# Altium schematic symbol library Analog Devices Data Converters Digital-to-Analog Converters.SchLib: 2231 symbols (part 53 of 135)
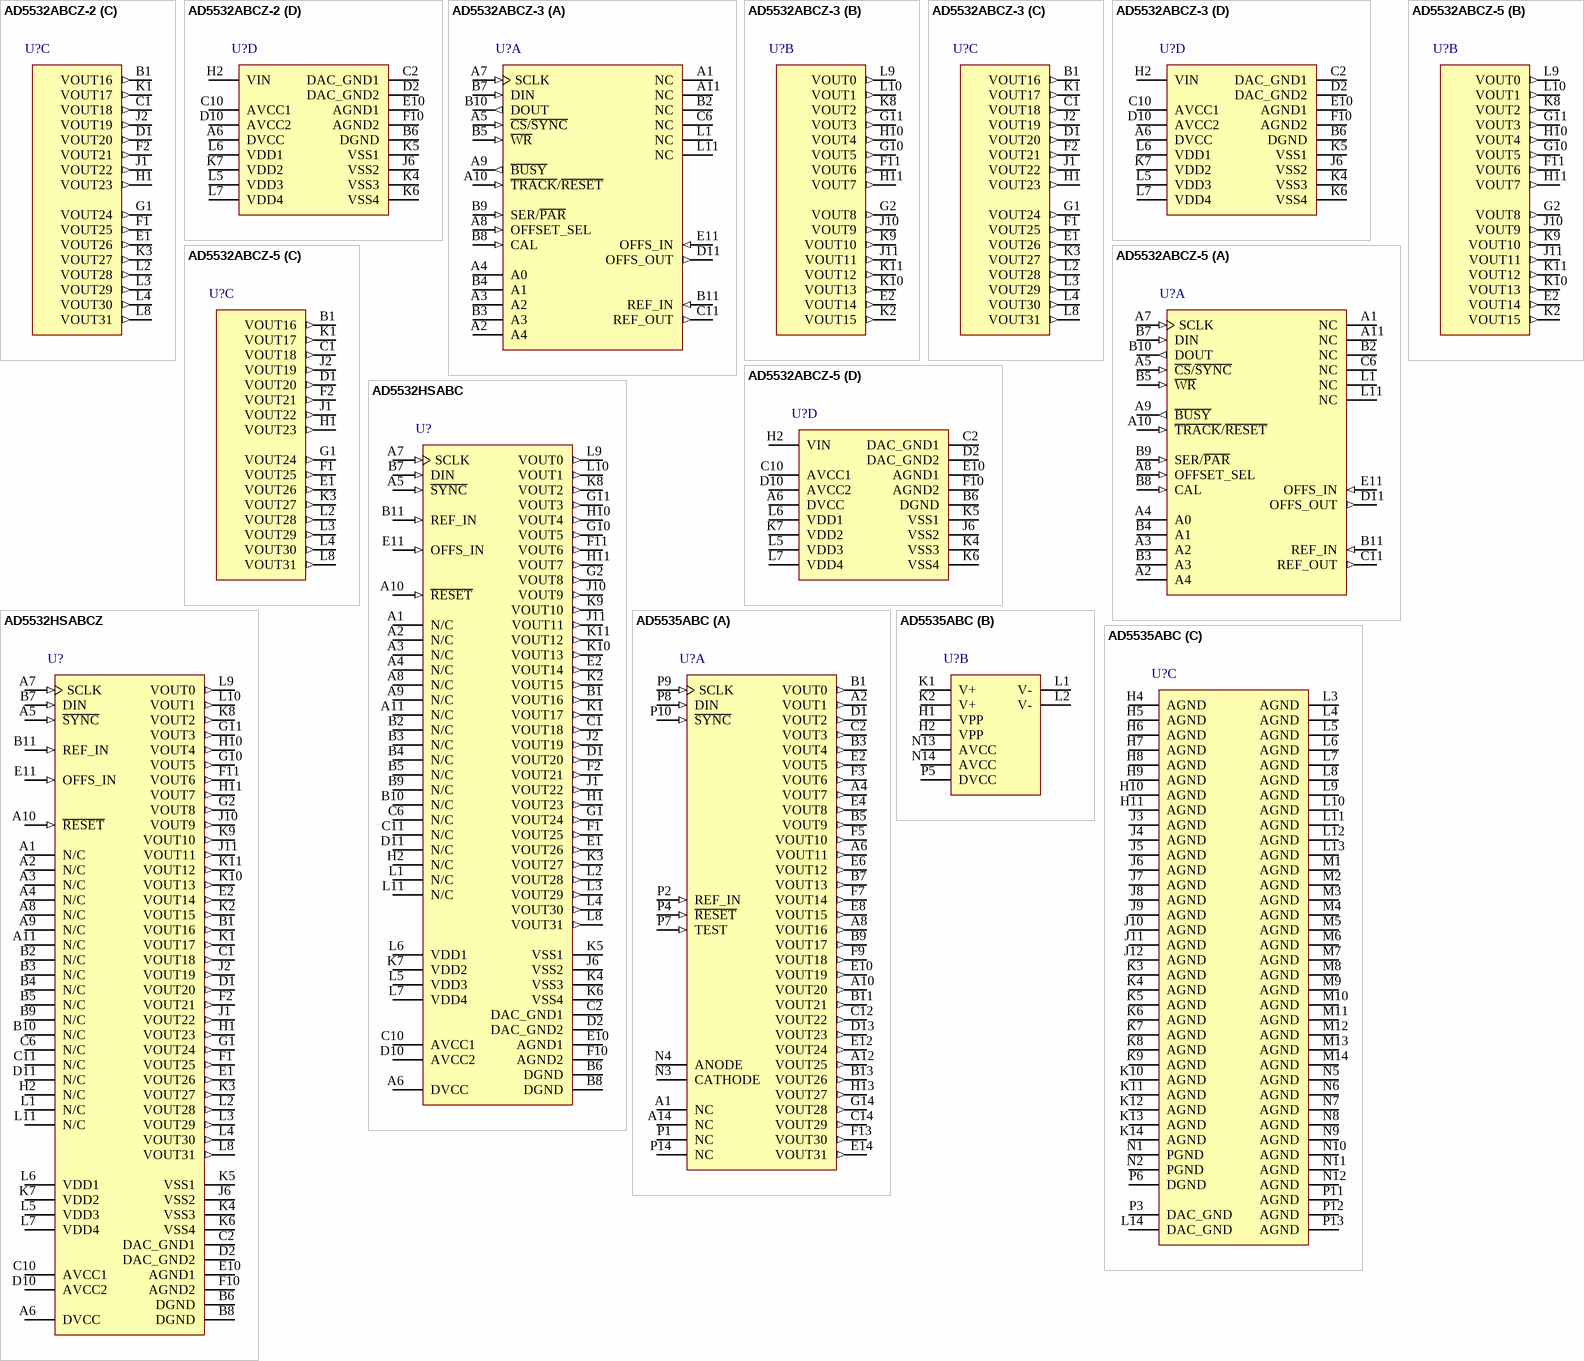
[diagram p165: symbols AD5532ABCZ-2 to AD5535ABC]

## AD5532ABCZ-5
designator U?
32 Channel 14-Bit Digital-to-Analog Converter, -40 to +85 degC, BC-74, Pb-Free, Tray; Generic Part Number: AD5532; Manufacturer: Analog Devices; PartNumber: AD5532ABCZ-5; # DAC Outputs: 32; Max V+: 16.5V; Op Pwr Diss: 623mW; Resolution (Bits): 14; Settling Time: 22µs; Single Supply: No; DatasheetVersion: Rev.D; PackageVersion: 061306-A; PackageReference: BC-74; PackageDescription: 74-Ball Chip Scale Package Ball Grid Array [CSP_BGA]; Supplier 1: Digi-Key; Supplier Part Number 1: AD5532ABCZ-5-ND; Supplier 2: Mouser; Supplier Part Number 2: 584-AD5532ABCZ-5; Packing: Tray; RoHS: Y; Mounting Technology: Surface Mount; Code_JEDEC: MO-192-ABD-1; ComponentLink1Description: Manufacturer URL; ComponentLink1URL: http://www.analog.com/en/index.html; ComponentLink2Description: Datasheet; ComponentLink2URL: http://www.analog.com/static/imported-files/data_sheets/AD5532.pdf; ComponentLink3Description: Package Specification; ComponentLink3URL: http://www.analog.com/static/imported-files/packages/466795438540441203902150BC_74.pdf; ComponentLink4Description: Product URL; ComponentLink4URL: http://www.analog.com/en/digital-to-analog-converters/da-converters/ad5532/products/product.html
footprint BC-74 (BGA, 74-Leads, Body 12x12mm, Pitch 1mm)
part A pins: A1 NC "Not connected", A2 A4 "Parallel Interface: 5 address pins for 32 channels. A4 = MSB of channel address. A0 = LSB. Internal pull-up devices on these logic inputs. Therefore, they can be left floating and default to a logic high condition.", A3 A2 "Parallel Interface: 5 address pins for 32 channels. A4 = MSB of channel address. A0 = LSB. Internal pull-up devices on these logic inputs. Therefore, they can be left floating and default to a logic high condition.", A4 A0 "Parallel Interface: 5 address pins for 32 channels. A4 = MSB of channel address. A0 = LSB. Internal pull-up devices on these logic inputs. Therefore, they can be left floating and default to a logic high condition.", A5 ~{CS}/~{SYNC} (in) "This is the active low Chip Select pin for the parallel interface and the Frame Synchronization pin for the serial interface.", A7 SCLK (in) "Serial Clock Input for Serial Interface. This operates at clock speeds up to 14 MHz (20 MHz in ISHA mode).", A8 OFFSET_SEL (in) "Parallel interface: Offset Select pin; active high. This is used to select the offset channel. Internal pull-down devices on these logic inputs. Therefore, they can be left floating and default to a logic low condition", A9 ~{BUSY} (out) "This output tells the user when the input voltage is being acquired. It goes low during acquisition and returns high when the acquisition operation is complete.", A10 ~{TRACK}/~{RESET} (in) "If this input is held high, VIN is acquired once the channel is addressed. While it is held low, the input to the gain/offset stage is switched directly to VIN. The addressed channel begins to acquire VIN on the rising edge (See Datasheet)", A11 NC "Not connected", B2 NC "Not connected", B3 A3 "Parallel Interface: 5 address pins for 32 channels. A4 = MSB of channel address. A0 = LSB. Internal pull-up devices on these logic inputs. Therefore, they can be left floating and default to a logic high condition.", B4 A1 "Parallel Interface: 5 address pins for 32 channels. A4 = MSB of channel address. A0 = LSB. Internal pull-up devices on these logic inputs. Therefore, they can be left floating and default to a logic high condition.", B5 ~{WR} (in) "Parallel interface: Write pin; active low. This is used in conjunction with the C\S\ pin to address the device using the parallel interface. Internal pull-down devices on these logic inputs. Therefore, they can be left (See Datasheet)", B7 DIN (in) "Data Input for Serial Interface. Data must be valid on the falling edge of SCLK. Internal pull-up devices on these logic inputs. Therefore, they can be left floating and default to a logic high condition.", B8 CAL (in) "Parallel Interface: Control input that allows all 32 channels to acquire VIN simultaneously. Internal pull-down devices on these logic inputs. Therefore, they can be left floating and default to a logic low condition", B9 SER/~{PAR} (in) "This pin allows the user to select whether the serial or parallel interface is used. If the pin is tied low, the parallel interface is used. If it is tied high, the serial interface is used. Internal pull-down devices on (See Datasheet)", B10 DOUT (out) "Output from the DAC registers for read back. Data is clocked out on the rising edge of SCLK and is valid on the falling edge of SCLK.", B11 REF_IN (in) "Reference voltage for Channels 0-31.", C6 NC "Not connected", C11 REF_OUT (out) "Reference Output Voltage.", D11 OFFS_OUT (out) "Offset Output. This is the acquired/programmed offset voltage which can be tied to OFFS_IN to offset the span.", E11 OFFS_IN (in) "Offset Input. The user can supply a voltage here to offset the output span. OFFS_OUT can also be tied to this pin if the user wants to drive this pin with the offset channel.", L1 NC "Not connected", L11 NC "Not connected"
part B pins: E2 VOUT14 (out) "Analog Output Voltages from the 32 channels.", F11 VOUT6 (out) "Analog Output Voltages from the 32 channels.", G2 VOUT8 (out) "Analog Output Voltages from the 32 channels.", G10 VOUT5 (out) "Analog Output Voltages from the 32 channels.", G11 VOUT3 (out) "Analog Output Voltages from the 32 channels.", H10 VOUT4 (out) "Analog Output Voltages from the 32 channels.", H11 VOUT7 (out) "Analog Output Voltages from the 32 channels.", J10 VOUT9 (out) "Analog Output Voltages from the 32 channels.", J11 VOUT11 (out) "Analog Output Voltages from the 32 channels.", K2 VOUT15 (out) "Analog Output Voltages from the 32 channels.", K8 VOUT2 (out) "Analog Output Voltages from the 32 channels.", K9 VOUT10 (out) "Analog Output Voltages from the 32 channels.", K10 VOUT13 (out) "Analog Output Voltages from the 32 channels.", K11 VOUT12 (out) "Analog Output Voltages from the 32 channels.", L9 VOUT0 (out) "Analog Output Voltages from the 32 channels.", L10 VOUT1 (out) "Analog Output Voltages from the 32 channels."
part C pins: B1 VOUT16 (out) "Analog Output Voltages from the 32 channels.", C1 VOUT18 (out) "Analog Output Voltages from the 32 channels.", D1 VOUT20 (out) "Analog Output Voltages from the 32 channels.", E1 VOUT26 (out) "Analog Output Voltages from the 32 channels.", F1 VOUT25 (out) "Analog Output Voltages from the 32 channels.", F2 VOUT21 (out) "Analog Output Voltages from the 32 channels.", G1 VOUT24 (out) "Analog Output Voltages from the 32 channels.", H1 VOUT23 (out) "Analog Output Voltages from the 32 channels.", J1 VOUT22 (out) "Analog Output Voltages from the 32 channels.", J2 VOUT19 (out) "Analog Output Voltages from the 32 channels.", K1 VOUT17 (out) "Analog Output Voltages from the 32 channels.", K3 VOUT27 (out) "Analog Output Voltages from the 32 channels.", L2 VOUT28 (out) "Analog Output Voltages from the 32 channels.", L3 VOUT29 (out) "Analog Output Voltages from the 32 channels.", L4 VOUT30 (out) "Analog Output Voltages from the 32 channels.", L8 VOUT31 (out) "Analog Output Voltages from the 32 channels."
part D pins: A6 DVCC (power) "Digital Supply pin. Voltage range from 2.7 V to 5.25 V.", B6 DGND (power) "Digital GND pin.", C2 DAC_GND1 (power) "Reference GND supply for all DACs.", C10 AVCC1 (power) "Analog Supply pin. Voltage range from 4.75 V to 5.25 V.", D2 DAC_GND2 (power) "Reference GND supply for all DACs.", D10 AVCC2 (power) "Analog Supply pin. Voltage range from 4.75 V to 5.25 V.", E10 AGND1 (power) "Analog GND pin.", F10 AGND2 (power) "Analog GND pin.", H2 VIN (power) "Analog Input Voltage. Connect this to AGND if operating in DAC mode only.", J6 VSS2 (power) "VSS Supply pins. Voltage range from -4.75 V to -16.5 V.", K4 VSS3 (power) "VSS Supply pin. Voltage range from -4.75 V to -16.5 V.", K5 VSS1 (power) "VSS Supply pin. Voltage range from -4.75 V to -16.5 V.", K6 VSS4 (power) "VSS Supply pin. Voltage range from -4.75 V to -16.5 V.", K7 VDD2 (power) "VDD Supply pin. Voltage range from 8 V to 16.5 V.", L5 VDD3 (power) "VDD Supply pin. Voltage range from 8 V to 16.5 V.", L6 VDD1 (power) "VDD Supply pin. Voltage range from 8 V to 16.5 V.", L7 VDD4 (power) "VDD Supply pin. Voltage range from 8 V to 16.5 V."

## AD5532HSABC
designator U?
32 Channel 14-Bit Digital-to-Analog Converter with High-Speed 3-Wire Serial Interface, -40 to +85 degC, BC-74, Tray; Generic Part Number: AD5532HS; Manufacturer: Analog Devices; PartNumber: AD5532HSABC; # DAC Outputs: 32; Max V+: 12V; Op Pwr Diss: 341mW; Resolution (Bits): 14; Settling Time: 10µs; Single Supply: No; DatasheetVersion: Rev.0; PackageVersion: 061306-A; PackageReference: BC-74; PackageDescription: 74-Ball Chip Scale Package Ball Grid Array [CSP_BGA]; Supplier 1: Digi-Key; Supplier Part Number 1: AD5532HSABC-ND; Supplier 2: Mouser; Supplier Part Number 2: 584-AD5532HSABC; Packing: Tray; RoHS: N; Mounting Technology: Surface Mount; Code_JEDEC: MO-192-ABD-1; ComponentLink1Description: Manufacturer URL; ComponentLink1URL: http://www.analog.com/en/index.html; ComponentLink2Description: Datasheet; ComponentLink2URL: http://www.analog.com/static/imported-files/data_sheets/AD5532HS.pdf; ComponentLink3Description: Package Specification; ComponentLink3URL: http://www.analog.com/static/imported-files/packages/466795438540441203902150BC_74.pdf; ComponentLink4Description: Product URL; ComponentLink4URL: http://www.analog.com/en/digital-to-analog-converters/da-converters/ad5532hs/products/product.html
footprint BC-74 (BGA, 74-Leads, Body 12x12mm, Pitch 1mm)
pins: A1  N/C "No connect", A2  N/C "No connect", A3  N/C "No connect", A4  N/C "No connect", A5  ~{SYNC} (in) "Active Low Input. This is the Frame Synchronization signal for the serial interface. While S\Y\N\C\ is low,data is transferred in on the falling edge of SCLK.", A6  DVCC (power) "Digital Supply Pins. Voltage range from 2.7 V to 5.25 V.", A7  SCLK (in) "Serial Clock Input. Data is clocked into the shift register on the falling edge of SCLK. This operates at clock speeds up to 30 MHz.", A8  N/C "No connect", A9  N/C "No connect", A10  ~{RESET} (in) "Active Low Input. This pin can also be used to reset the complete device to its power-on-reset conditions.", A11  N/C "No connect", B1  VOUT16 (out) "Analog Output Voltage from the 32 Channels.", B2  N/C "No connect", B3  N/C "No connect", B4  N/C "No connect", B5  N/C "No connect", B6  DGND (power) "Digital GND Pin.", B7  DIN (in) "Serial Data Input. Data must be valid on the falling edge of SCLK.", B8  DGND (power) "Digital GND Pin.", B9  N/C "No connect", B10  N/C "No connect", B11  REF_IN (in) "Reference Voltage for Channels 0-31.", C1  VOUT18 (out) "Analog Output Voltage from the 32 Channels.", C2  DAC_GND1 (power) "Reference GND Supply for All the DACs.", C6  N/C "No connect", C10  AVCC1 (power) "Analog Supply Pin. Voltage range from 4.75 V to 5.25 V.", C11  N/C "No connect", D1  VOUT20 (out) "Analog Output Voltage from the 32 Channels.", D2  DAC_GND2 (power) "Reference GND Supply for All the DACs.", D10  AVCC2 (power) "Analog Supply Pin. Voltage range from 4.75 V to 5.25 V.", D11  N/C "No connect", E1  VOUT26 (out) "Analog Output Voltage from the 32 Channels.", E2  VOUT14 (out) "Analog Output Voltage from the 32 Channels.", E10  AGND1 (power) "Analog GND Pin.", E11  OFFS_IN (in) "Offset Input. The user can connect this to GND or REF_IN to determine the output span.", F1  VOUT25 (out) "Analog Output Voltage from the 32 Channels.", F2  VOUT21 (out) "Analog Output Voltage from the 32 Channels.", F10  AGND2 (power) "Analog GND Pin.", F11  VOUT6 (out) "Analog Output Voltage from the 32 Channels.", G1  VOUT24 (out) "Analog Output Voltage from the 32 Channels.", G2  VOUT8 (out) "Analog Output Voltage from the 32 Channels.", G10  VOUT5 (out) "Analog Output Voltage from the 32 Channels.", G11  VOUT3 (out) "Analog Output Voltage from the 32 Channels.", H1  VOUT23 (out) "Analog Output Voltage from the 32 Channels.", H2  N/C "No connect", H10  VOUT4 (out) "Analog Output Voltage from the 32 Channels.", H11  VOUT7 (out) "Analog Output Voltage from the 32 Channels.", J1  VOUT22 (out) "Analog Output Voltage from the 32 Channels.", J2  VOUT19 (out) "Analog Output Voltage from the 32 Channels.", J6  VSS2 (power) "VSS Supply Pin. Voltage range from -4.75 V to -12 V.", J10  VOUT9 (out) "Analog Output Voltage from the 32 Channels.", J11  VOUT11 (out) "Analog Output Voltage from the 32 Channels.", K1  VOUT17 (out) "Analog Output Voltage from the 32 Channels.", K2  VOUT15 (out) "Analog Output Voltage from the 32 Channels.", K3  VOUT27 (out) "Analog Output Voltage from the 32 Channels.", K4  VSS3 (power) "VSS Supply Pin. Voltage range from -4.75 V to -12 V.", K5  VSS1 (power) "VSS Supply Pin. Voltage range from -4.75 V to -12 V.", K6  VSS4 (power) "VSS Supply Pin. Voltage range from -4.75 V to -12 V.", K7  VDD2 (power) "VDD Supply Pin. Voltage range from 8 V to 12 V.", K8  VOUT2 (out) "Analog Output Voltage from the 32 Channels.", K9  VOUT10 (out) "Analog Output Voltage from the 32 Channels.", K10  VOUT13 (out) "Analog Output Voltage from the 32 Channels.", K11  VOUT12 (out) "Analog Output Voltage from the 32 Channels.", L1  N/C "No connect", L2  VOUT28 (out) "Analog Output Voltage from the 32 Channels.", L3  VOUT29 (out) "Analog Output Voltage from the 32 Channels.", L4  VOUT30 (out) "Analog Output Voltage from the 32 Channels.", L5  VDD3 (power) "VDD Supply Pin. Voltage range from 8 V to 12 V.", L6  VDD1 (power) "VDD Supply Pin. Voltage range from 8 V to 12 V.", L7  VDD4 (power) "VDD Supply Pin. Voltage range from 8 V to 12 V.", L8  VOUT31 (out) "Analog Output Voltage from the 32 Channels.", L9  VOUT0 (out) "Analog Output Voltage from the 32 Channels.", L10  VOUT1 (out) "Analog Output Voltage from the 32 Channels.", L11  N/C "No connect"

## AD5532HSABCZ
designator U?
32 Channel 14-Bit Digital-to-Analog Converter with High-Speed 3-Wire Serial Interface, -40 to +85 degC, BC-74, Pb-Free, Tray; Generic Part Number: AD5532HS; Manufacturer: Analog Devices; PartNumber: AD5532HSABCZ; # DAC Outputs: 32; Max V+: 12V; Op Pwr Diss: 341mW; Resolution (Bits): 14; Settling Time: 10µs; Single Supply: No; DatasheetVersion: Rev.0; PackageVersion: 061306-A; PackageReference: BC-74; PackageDescription: 74-Ball Chip Scale Package Ball Grid Array [CSP_BGA]; Supplier 1: Digi-Key; Supplier Part Number 1: AD5532HSABCZ-ND; Supplier 2: Newark; Supplier Part Number 2: 12M8551; Supplier 3: Mouser; Supplier Part Number 3: 584-AD5532HSABCZ; Packing: Tray; RoHS: Y; Mounting Technology: Surface Mount; Code_JEDEC: MO-192-ABD-1; ComponentLink1Description: Manufacturer URL; ComponentLink1URL: http://www.analog.com/en/index.html; ComponentLink2Description: Datasheet; ComponentLink2URL: http://www.analog.com/static/imported-files/data_sheets/AD5532HS.pdf; ComponentLink3Description: Package Specification; ComponentLink3URL: http://www.analog.com/static/imported-files/packages/466795438540441203902150BC_74.pdf; ComponentLink4Description: Product URL; ComponentLink4URL: http://www.analog.com/en/digital-to-analog-converters/da-converters/ad5532hs/products/product.html
footprint BC-74 (BGA, 74-Leads, Body 12x12mm, Pitch 1mm)
pins: A1  N/C "No connect", A2  N/C "No connect", A3  N/C "No connect", A4  N/C "No connect", A5  ~{SYNC} (in) "Active Low Input. This is the Frame Synchronization signal for the serial interface. While S\Y\N\C\ is low,data is transferred in on the falling edge of SCLK.", A6  DVCC (power) "Digital Supply Pins. Voltage range from 2.7 V to 5.25 V.", A7  SCLK (in) "Serial Clock Input. Data is clocked into the shift register on the falling edge of SCLK. This operates at clock speeds up to 30 MHz.", A8  N/C "No connect", A9  N/C "No connect", A10  ~{RESET} (in) "Active Low Input. This pin can also be used to reset the complete device to its power-on-reset conditions.", A11  N/C "No connect", B1  VOUT16 (out) "Analog Output Voltage from the 32 Channels.", B2  N/C "No connect", B3  N/C "No connect", B4  N/C "No connect", B5  N/C "No connect", B6  DGND (power) "Digital GND Pin.", B7  DIN (in) "Serial Data Input. Data must be valid on the falling edge of SCLK.", B8  DGND (power) "Digital GND Pin.", B9  N/C "No connect", B10  N/C "No connect", B11  REF_IN (in) "Reference Voltage for Channels 0-31.", C1  VOUT18 (out) "Analog Output Voltage from the 32 Channels.", C2  DAC_GND1 (power) "Reference GND Supply for All the DACs.", C6  N/C "No connect", C10  AVCC1 (power) "Analog Supply Pin. Voltage range from 4.75 V to 5.25 V.", C11  N/C "No connect", D1  VOUT20 (out) "Analog Output Voltage from the 32 Channels.", D2  DAC_GND2 (power) "Reference GND Supply for All the DACs.", D10  AVCC2 (power) "Analog Supply Pin. Voltage range from 4.75 V to 5.25 V.", D11  N/C "No connect", E1  VOUT26 (out) "Analog Output Voltage from the 32 Channels.", E2  VOUT14 (out) "Analog Output Voltage from the 32 Channels.", E10  AGND1 (power) "Analog GND Pin.", E11  OFFS_IN (in) "Offset Input. The user can connect this to GND or REF_IN to determine the output span.", F1  VOUT25 (out) "Analog Output Voltage from the 32 Channels.", F2  VOUT21 (out) "Analog Output Voltage from the 32 Channels.", F10  AGND2 (power) "Analog GND Pin.", F11  VOUT6 (out) "Analog Output Voltage from the 32 Channels.", G1  VOUT24 (out) "Analog Output Voltage from the 32 Channels.", G2  VOUT8 (out) "Analog Output Voltage from the 32 Channels.", G10  VOUT5 (out) "Analog Output Voltage from the 32 Channels.", G11  VOUT3 (out) "Analog Output Voltage from the 32 Channels.", H1  VOUT23 (out) "Analog Output Voltage from the 32 Channels.", H2  N/C "No connect", H10  VOUT4 (out) "Analog Output Voltage from the 32 Channels.", H11  VOUT7 (out) "Analog Output Voltage from the 32 Channels.", J1  VOUT22 (out) "Analog Output Voltage from the 32 Channels.", J2  VOUT19 (out) "Analog Output Voltage from the 32 Channels.", J6  VSS2 (power) "VSS Supply Pin. Voltage range from -4.75 V to -12 V.", J10  VOUT9 (out) "Analog Output Voltage from the 32 Channels.", J11  VOUT11 (out) "Analog Output Voltage from the 32 Channels.", K1  VOUT17 (out) "Analog Output Voltage from the 32 Channels.", K2  VOUT15 (out) "Analog Output Voltage from the 32 Channels.", K3  VOUT27 (out) "Analog Output Voltage from the 32 Channels.", K4  VSS3 (power) "VSS Supply Pin. Voltage range from -4.75 V to -12 V.", K5  VSS1 (power) "VSS Supply Pin. Voltage range from -4.75 V to -12 V.", K6  VSS4 (power) "VSS Supply Pin. Voltage range from -4.75 V to -12 V.", K7  VDD2 (power) "VDD Supply Pin. Voltage range from 8 V to 12 V.", K8  VOUT2 (out) "Analog Output Voltage from the 32 Channels.", K9  VOUT10 (out) "Analog Output Voltage from the 32 Channels.", K10  VOUT13 (out) "Analog Output Voltage from the 32 Channels.", K11  VOUT12 (out) "Analog Output Voltage from the 32 Channels.", L1  N/C "No connect", L2  VOUT28 (out) "Analog Output Voltage from the 32 Channels.", L3  VOUT29 (out) "Analog Output Voltage from the 32 Channels.", L4  VOUT30 (out) "Analog Output Voltage from the 32 Channels.", L5  VDD3 (power) "VDD Supply Pin. Voltage range from 8 V to 12 V.", L6  VDD1 (power) "VDD Supply Pin. Voltage range from 8 V to 12 V.", L7  VDD4 (power) "VDD Supply Pin. Voltage range from 8 V to 12 V.", L8  VOUT31 (out) "Analog Output Voltage from the 32 Channels.", L9  VOUT0 (out) "Analog Output Voltage from the 32 Channels.", L10  VOUT1 (out) "Analog Output Voltage from the 32 Channels.", L11  N/C "No connect"

## AD5535ABC
designator U?
32 Channel 14-Bit Full-Scale Output Voltage Digital-to-Analog Converter, 50 to 200 V, -10 to +85 degC, BC-124-2, Tray; Generic Part Number: AD5535; Manufacturer: Analog Devices; PartNumber: AD5535ABC; # DAC Outputs: 32; Max V+: 5.25V; Op Pwr Diss: 787mW; Resolution (Bits): 14; Settling Time: 65µs; Single Supply: No; DatasheetVersion: Rev.A; PackageVersion: 012006-0; PackageReference: BC-124-2; PackageDescription: 124-Ball Chip Scale Package Ball Grid Array [CSP_BGA]; Supplier 1: Mouser; Supplier Part Number 1: N/A; Packing: Tray; RoHS: N; Mounting Technology: Surface Mount; Code_JEDEC: MO-192-AAE-1; ComponentLink1Description: Manufacturer URL; ComponentLink1URL: http://www.analog.com/en/index.html; ComponentLink2Description: Datasheet; ComponentLink2URL: http://www.analog.com/static/imported-files/data_sheets/AD5535.pdf; ComponentLink3Description: Package Specification; ComponentLink3URL: http://www.analog.com/static/imported-files/packages/PKG_PDF/CSPBGA%20(BC)/BC_124_2.pdf; ComponentLink4Description: Product URL; ComponentLink4URL: http://www.analog.com/en/digital-to-analog-converters/da-converters/ad5535/products/product.html
footprint BC-124-2 (BGA, 124-Leads, Body 15x15mm, Pitch 1mm)
part A pins: A1 NC "No connect pins. The user should not connect any signals to these pins.", A2 VOUT1 (out) "Analog Output Voltages from the 32 Channels.", A4 VOUT7 (out) "Analog Output Voltages from the 32 Channels.", A6 VOUT11 (out) "Analog Output Voltages from the 32 Channels.", A8 VOUT16 (out) "Analog Output Voltages from the 32 Channels.", A10 VOUT20 (out) "Analog Output Voltages from the 32 Channels.", A12 VOUT25 (out) "Analog Output Voltages from the 32 Channels.", A14 NC "No connect pins. The user should not connect any signals to these pins.", B1 VOUT0 (out) "Analog Output Voltages from the 32 Channels.", B3 VOUT4 (out) "Analog Output Voltages from the 32 Channels.", B5 VOUT9 (out) "Analog Output Voltages from the 32 Channels.", B7 VOUT13 (out) "Analog Output Voltages from the 32 Channels.", B9 VOUT17 (out) "Analog Output Voltages from the 32 Channels.", B11 VOUT21 (out) "Analog Output Voltages from the 32 Channels.", B13 VOUT26 (out) "Analog Output Voltages from the 32 Channels.", C2 VOUT3 (out) "Analog Output Voltages from the 32 Channels.", C12 VOUT22 (out) "Analog Output Voltages from the 32 Channels.", C14 VOUT29 (out) "Analog Output Voltages from the 32 Channels.", D1 VOUT2 (out) "Analog Output Voltages from the 32 Channels.", D13 VOUT23 (out) "Analog Output Voltages from the 32 Channels.", E2 VOUT5 (out) "Analog Output Voltages from the 32 Channels.", E4 VOUT8 (out) "Analog Output Voltages from the 32 Channels.", E6 VOUT12 (out) "Analog Output Voltages from the 32 Channels.", E8 VOUT15 (out) "Analog Output Voltages from the 32 Channels.", E10 VOUT19 (out) "Analog Output Voltages from the 32 Channels.", E12 VOUT24 (out) "Analog Output Voltages from the 32 Channels.", E14 VOUT31 (out) "Analog Output Voltages from the 32 Channels.", F3 VOUT6 (out) "Analog Output Voltages from the 32 Channels.", F5 VOUT10 (out) "Analog Output Voltages from the 32 Channels.", F7 VOUT14 (out) "Analog Output Voltages from the 32 Channels.", F9 VOUT18 (out) "Analog Output Voltages from the 32 Channels.", F13 VOUT30 (out) "Analog Output Voltages from the 32 Channels.", G14 VOUT28 (out) "Analog Output Voltages from the 32 Channels.", H13 VOUT27 (out) "Analog Output Voltages from the 32 Channels.", N3 CATHODE "Cathode of Internal Diode for Diode Temperature Measurement.", N4 ANODE "Anode of Internal Diode for Diode Temperature Measurement.", P1 NC "No connect pins. The user should not connect any signals to these pins.", P2 REF_IN (in) "Reference Voltage for Channel 0 to Channel 31. Reference input range is 1 V to 4 V and can be used to program the full-scale output voltage from 50 V to 200 V.", P4 ~{RESET} (in) "Active Low Input. This pin can also be used to reset the complete device to its power-on reset conditions. Zero code is loaded to the DACs.", P7 TEST (in) "Allows the same data to be simultaneously loaded to all channels of the AD5535. This pin is used for calibration purposes when loading zero scale and full scale to all channels. To invoke this feature, bring the TEST pin (See Datasheet)", P8 DIN (in) "Serial Data Input. Data must be valid upon the falling edge of SCLK.", P9 SCLK (in) "Serial Clock Input. Data is clocked into the shift register upon the falling edge of SCLK. This operates at clock speeds of up to 30 MHz.", P10 ~{SYNC} (in) "Active Low Input. This is the frame synchronization signal for the serial interface. While S\Y\N\C\ is low, data is transferred in upon the falling edge of SCLK.", P14 NC "No connect pins. The user should not connect any signals to these pins."
part B pins: H1 VPP (power) "Output Amplifier High Voltage Supply. Voltage range from (REF_IN x 50) + 10 V to 225 V.", H2 VPP (power) "Output Amplifier High Voltage Supply. Voltage range from (REF_IN x 50) + 10 V to 225 V.", K1 V+ (power) "V+ Amplifier Supply Pins. Voltage range from 4.75 V to 5.25 V.", K2 V+ (power) "V+ Amplifier Supply Pins. Voltage range from 4.75 V to 5.25 V.", L1 V- (power) "V- Amplifier Supply Pins. Voltage range from -4.75 V to -5.25 V.", L2 V- (power) "V- Amplifier Supply Pins. Voltage range from -4.75 V to -5.25 V.", N13 AVCC (power) "Analog Supply Pins. Voltage range from 4.75 V to 5.25 V.", N14 AVCC (power) "Analog Supply Pins. Voltage range from 4.75 V to 5.25 V.", P5 DVCC (power) "Digital Supply Pins. Voltage range from 2.7 V to 5.25 V."
part C pins: H4 AGND (power) "Analog GND Pin.", H5 AGND (power) "Analog GND Pin.", H6 AGND (power) "Analog GND Pin.", H7 AGND (power) "Analog GND Pin.", H8 AGND (power) "Analog GND Pin.", H9 AGND (power) "Analog GND Pin.", H10 AGND (power) "Analog GND Pin.", H11 AGND (power) "Analog GND Pin.", J3 AGND (power) "Analog GND Pin.", J4 AGND (power) "Analog GND Pin.", J5 AGND (power) "Analog GND Pin.", J6 AGND (power) "Analog GND Pin.", J7 AGND (power) "Analog GND Pin.", J8 AGND (power) "Analog GND Pin.", J9 AGND (power) "Analog GND Pin.", J10 AGND (power) "Analog GND Pin.", J11 AGND (power) "Analog GND Pin.", J12 AGND (power) "Analog GND Pin.", K3 AGND (power) "Analog GND Pin.", K4 AGND (power) "Analog GND Pin.", K5 AGND (power) "Analog GND Pin.", K6 AGND (power) "Analog GND Pin.", K7 AGND (power) "Analog GND Pin.", K8 AGND (power) "Analog GND Pin.", K9 AGND (power) "Analog GND Pin.", K10 AGND (power) "Analog GND Pin.", K11 AGND (power) "Analog GND Pin.", K12 AGND (power) "Analog GND Pin.", K13 AGND (power) "Analog GND Pin.", K14 AGND (power) "Analog GND Pin.", L3 AGND (power) "Analog GND Pin.", L4 AGND (power) "Analog GND Pin.", L5 AGND (power) "Analog GND Pin.", L6 AGND (power) "Analog GND Pin.", L7 AGND (power) "Analog GND Pin.", L8 AGND (power) "Analog GND Pin.", L9 AGND (power) "Analog GND Pin.", L10 AGND (power) "Analog GND Pin.", L11 AGND (power) "Analog GND Pin.", L12 AGND (power) "Analog GND Pin.", L13 AGND (power) "Analog GND Pin.", L14 DAC_GND (power) "Reference GND Supply for All DACs.", M1 AGND (power) "Analog GND Pin.", M2 AGND (power) "Analog GND Pin.", M3 AGND (power) "Analog GND Pin.", M4 AGND (power) "Analog GND Pin.", M5 AGND (power) "Analog GND Pin.", M6 AGND (power) "Analog GND Pin.", M7 AGND (power) "Analog GND Pin.", M8 AGND (power) "Analog GND Pin.", M9 AGND (power) "Analog GND Pin.", M10 AGND (power) "Analog GND Pin.", M11 AGND (power) "Analog GND Pin.", M12 AGND (power) "Analog GND Pin.", M13 AGND (power) "Analog GND Pin.", M14 AGND (power) "Analog GND Pin.", N1 PGND (power) "Output Amplifier Ground Reference Pins.", N2 PGND (power) "Output Amplifier Ground Reference Pins.", N5 AGND (power) "Analog GND Pin.", N6 AGND (power) "Analog GND Pin.", N7 AGND (power) "Analog GND Pin.", N8 AGND (power) "Analog GND Pin.", N9 AGND (power) "Analog GND Pin.", N10 AGND (power) "Analog GND Pin.", N11 AGND (power) "Analog GND Pin.", N12 AGND (power) "Analog GND Pin.", P3 DAC_GND (power) "Reference GND Supply for All DACs.", P6 DGND (power) "Digital GND Pin.", P11 AGND (power) "Analog GND Pin.", P12 AGND (power) "Analog GND Pin.", P13 AGND (power) "Analog GND Pin."
